# Altium footprint library Footprints.PcbLib: 196 footprints (part 1 of 13)
Each footprint in its own frame and in the unit in brackets; x right, y up, seen from the top. Pads: shape width x height; smd on the part's side, far side on the other; paste and mask are expansions set on the pad; w line width, h text height; cw(c..) or ccw(c..) is an arc to the next point about the centre after c.
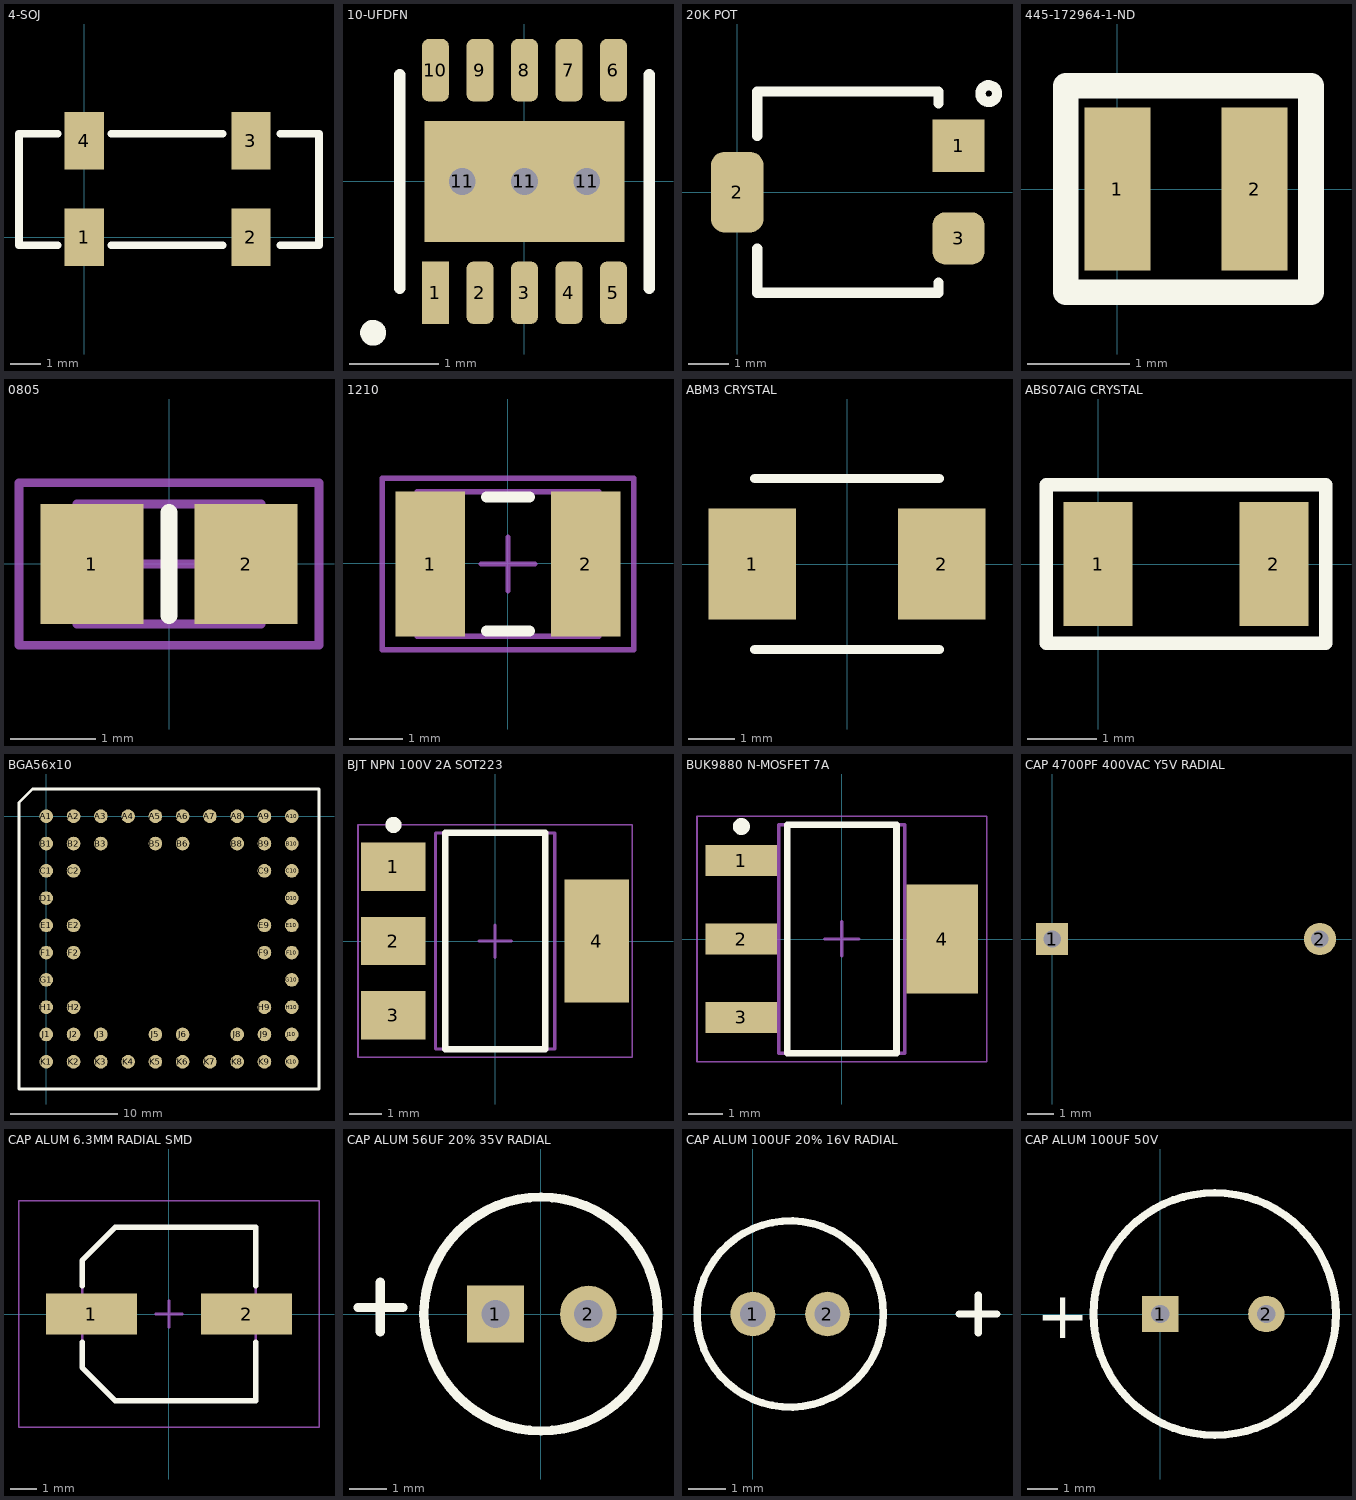
[diagram p0: the footprints below, top view; thin cyan lines are the x and y axes]

## 4-SOJ [mm]
pads (4):
  rect 1.3x1.9 smd: 1(0,0) 2(5.5,0) 3(5.5,3.2) 4(0,3.2)
Top Overlay:
  lines w0.254: -0.889,-0.254 -2.159,-0.254 -2.159,3.429 -0.889,3.429 ; 0.889,-0.254 4.572,-0.254 ; 0.889,3.429 4.572,3.429 ; 6.477,-0.254 7.747,-0.254 7.747,3.429 6.477,3.429

## 10-UFDFN [mm]
pads (14):
  rect 0.3x0.7 smd: 1(-1,-1.25)
  rrect50% 0.3x0.7 smd: 2(-0.5,-1.25) 3(0,-1.25) 4(0.5,-1.25) 5(1,-1.25) 6(1,1.25) 7(0.5,1.25) 8(0,1.25) 9(-0.5,1.25) 10(-1,1.25)
  round 0.6 hole 0.3: 11(-0.7,0) 11(0,0) 11(0.7,0)
  rect 2.25x1.36 smd paste-0.2: 11(0,0)
Top Overlay:
  circle w0.15: c-1.7,-1.7 r0.07
  lines w0.127: -1.4,-1.2 -1.4,1.2 ; 1.4,-1.2 1.4,1.2
3D body: height 0.6, standoff 0, extent -1.275,-1.275 1.275,1.275

## 20K POT [mm]
height 2.7
pads (3):
  rect 1.3x1.3 smd: 1(5.5,1.15)
  rrect50% 1.3x2 smd: 2(0,0)
  rrect50% 1.3x1.3 smd: 3(5.5,-1.15)
Top Overlay:
  circle w0.254: c6.25,2.45 r0.206
  lines w0.254: 0.5,-1.4 0.5,-2.5 5,-2.5 5,-2.25 ; 0.5,1.4 0.5,2.5 5,2.5 5,2.2

## 445-172964-1-ND [mm]
pads (2):
  rect 0.65x1.6 smd: 1(0,0) 2(1.35,0)
Top Overlay:
  lines w0.254: -0.508,-1.016 -0.508,1.016 1.905,1.016 1.905,-1.016 -0.508,-1.016

## 0805 [mm]
pads (2):
  rect 1.2x1.4 smd: 1(-0.903,-0.001) 2(0.897,-0.001)
Top Overlay:
  lines w0.2: -0.003,-0.601 -0.003,0.599
Mechanical 13:
  lines w0.1: -1.078,-0.701 1.072,-0.701 1.072,0.699 -1.078,0.699 -1.078,-0.701
Mechanical 15:
  lines w0.1: -0.503,-0.001 0.497,-0.001 ; -0.003,-0.501 -0.003,0.499 ; -1.753,-0.951 1.747,-0.951 1.747,0.949 -1.753,0.949 -1.753,-0.951
3D body: height 0.7, standoff 0, extent -1.078,-0.701 1.072,0.699

## 1210 [mm]
pads (2):
  rect 1.3x2.7 smd: 1(-1.441,-0.01) 2(1.459,-0.01)
Top Overlay:
  lines w0.2: -0.391,-1.26 0.409,-1.26 ; -0.391,1.24 0.409,1.24
Mechanical 13:
  lines w0.1: -1.691,-1.36 1.709,-1.36 1.709,1.34 -1.691,1.34 -1.691,-1.36
Mechanical 15:
  lines w0.1: -0.491,-0.01 0.509,-0.01 ; 0.009,-0.51 0.009,0.49 ; -2.341,-1.61 2.359,-1.61 2.359,1.59 -2.341,1.59 -2.341,-1.61
3D body: height 1.5, standoff 0, extent -1.691,-1.36 1.709,1.34

## ABM3 CRYSTAL [mm]
pads (2):
  rect 1.9x2.4 smd: 1(-2.05,0) 2(2.05,0)
Top Overlay:
  lines w0.2: -2,-1.85 2,-1.85 ; -2,1.85 2,1.85
3D body "ABM3.STEP": height 1.3, standoff 0, extent -2.5,-1.6 2.5,1.6

## ABS07AIG CRYSTAL [mm]
pads (2):
  rect 1x1.8 smd: 1(0,0) 2(2.55,0)
Top Overlay:
  lines w0.2: -0.75,-1.15 -0.75,1.15 3.3,1.15 3.3,-1.15 -0.75,-1.15
3D body "ABS07.STEP": height 0.89, standoff 0, extent -0.325,-0.749 2.875,0.749

## BGA56x10 [mm]
pads (56):
  round 1.27 smd: A1(0,0) A2(2.54,0) A3(5.08,0) A4(7.62,0) A5(10.16,0) A6(12.7,0) A7(15.24,0) A8(17.78,0) A9(20.32,0) A10(22.86,0) B1(0,-2.54) B2(2.54,-2.54) B3(5.08,-2.54) B5(10.16,-2.54) B6(12.7,-2.54) B8(17.78,-2.54) B9(20.32,-2.54) B10(22.86,-2.54) C1(0,-5.08) C2(2.54,-5.08) C9(20.32,-5.08) C10(22.86,-5.08) D1(0,-7.62) D10(22.86,-7.62) E1(0,-10.16) E2(2.54,-10.16) E9(20.32,-10.16) E10(22.86,-10.16) F1(0,-12.7) F2(2.54,-12.7) F9(20.32,-12.7) F10(22.86,-12.7) G1(0,-15.24) G10(22.86,-15.24) H1(0,-17.78) H2(2.54,-17.78) H9(20.32,-17.78) H10(22.86,-17.78) J1(0,-20.32) J2(2.54,-20.32) J3(5.08,-20.32) J5(10.16,-20.32) J6(12.7,-20.32) J8(17.78,-20.32) J9(20.32,-20.32) J10(22.86,-20.32) K1(0,-22.86) K2(2.54,-22.86) K3(5.08,-22.86) K4(7.62,-22.86) K5(10.16,-22.86) K6(12.7,-22.86) K7(15.24,-22.86) K8(17.78,-22.86) K9(20.32,-22.86) K10(22.86,-22.86)
Top Overlay:
  lines w0.254: -2.54,-25.4 -2.54,1.27 -1.27,2.54 25.4,2.54 25.4,-25.4 -2.54,-25.4

## BJT NPN 100V 2A SOT223 [mm] "SOT223, 4-Leads, Body 6.50x7.00mm (avg), Pitch 2.30mm, IPC Medium Density"
height 1.75
pads (4):
  rect 2x1.5 smd: 1(-3.15,2.3) 2(-3.15,0) 3(-3.15,-2.3)
  rect 2x3.8 smd: 4(3.15,0)
Top Overlay:
  circle w0.25: c-3.15,3.6 r0.125
  lines w0.2: -1.55,-3.35 1.55,-3.35 1.55,3.35 -1.55,3.35 -1.55,-3.35
Mechanical 13:
  lines w0.1: -1.85,-3.35 1.85,-3.35 1.85,3.35 -1.85,3.35 -1.85,-3.35
Mechanical 15:
  lines w0.05: -4.25,-3.6 4.25,-3.6 4.25,3.6 -4.25,3.6 -4.25,-3.6
  lines w0.1: -0.5,0 0.5,0 ; 0,-0.5 0,0.5
3D body "BJT NPN 100V 2A SOT223.step": height 1.75, standoff 0, extent -3.5,-3.35 3.5,3.35

## BUK9880 N-MOSFET 7A [mm] "SOT223, 4-Leads, Body 6.50x7.00mm (avg), Pitch 2.30mm, IPC Medium Density"
height 1.8
pads (4):
  rect 2.1x0.9 smd: 1(-2.95,2.3) 2(-2.95,0) 3(-2.95,-2.3)
  rect 2.1x3.2 smd: 4(2.95,0)
Top Overlay:
  circle w0.25: c-2.95,3.3 r0.125
  lines w0.2: -1.6,-3.35 -1.6,3.35 1.6,3.35 1.6,-3.35 -1.6,-3.35
Mechanical 13:
  lines w0.1: -1.85,-3.35 -1.85,3.35 1.85,3.35 1.85,-3.35 -1.85,-3.35
Mechanical 15:
  lines w0.05: -4.25,-3.6 -4.25,3.6 4.25,3.6 4.25,-3.6 -4.25,-3.6
  lines w0.1: -0.5,0 0.5,0 ; 0,-0.5 0,0.5
3D body "SOT230P700X180-4N.step": height 1.8, standoff 0, extent -3.5,-3.35 3.5,3.35

## CAP 4700PF 400VAC Y5V RADIAL [mm] "4700pF ?0% 400VAC Ceramic Capacitor Y5V (F) Radial, Disc"
pads (2):
  rect 1.2x1.2 hole 0.65: 1(0,0)
  round 1.2 hole 0.65: 2(10,0)
3D body "C951U472MVVDBA7317.step": height 16, standoff -19.8, extent -1,-3 11,2.502

## CAP ALUM 6.3MM RADIAL SMD [mm] "Aluminum Electrolytic Capacitor, Body 6.50x6.50x5.50mm, IPC Low Density"
height 5.5
pads (2):
  rect 3.45x1.55 smd: 1(-2.95,0) 2(2.95,0)
Top Overlay:
  lines w0.2: -3.3,-1.075 -3.3,-2.037 -2.037,-3.3 3.3,-3.3 3.3,-1.075 ; -3.3,1.075 -3.3,2.037 -2.037,3.3 3.3,3.3 3.3,1.075
Mechanical 13:
  lines w0.1: -3.3,-2.037 -3.3,2.037 -2.037,3.3 3.3,3.3 3.3,-3.3 -2.037,-3.3 -3.3,-2.037
Mechanical 15:
  lines w0.05: -5.7,-4.3 5.7,-4.3 5.7,4.3 -5.7,4.3 -5.7,-4.3
  lines w0.1: -0.5,0 0.5,0 ; 0,-0.5 0,0.5
3D body "CAP 6.3MM RADIAL SMD.step": height 5.5, standoff -0.8, extent -3.9,-3.3 3.9,3.3

## CAP ALUM 56UF 20% 35V RADIAL [mil] "56µF 35V Aluminum Electrolytic Capacitors Radial, Can 1000 Hrs @ 105°C"
pads (2):
  rect 60x60 hole 30: 1(-48.23,0)
  round 60 hole 30: 2(50.2,0)
Top Overlay:
  circle w10: c0,0 r124.02
  lines w10: -193.9,6.89 -146.65,6.89 ; -170.28,-18.7 -170.28,33.46
3D body: height 440.94, standoff 0, extent -124.02,-123.89 124.02,123.89

## CAP ALUM 100UF 20% 16V RADIAL [mm] "100µF 16V Aluminum Capacitors Radial, Can 2000 Hrs @ 105°C"
height 12.5
pads (2):
  round 1.2 hole 0.7: 1(0,0) 2(2,0)
Top Overlay:
  circle w0.2: c1,0 r2.5
  lines w0.2: 5.532,0 6.548,0 ; 6.04,-0.508 6.04,0.508

## CAP ALUM 100UF 50V [mm] "CAP ALUM 100UF 20% 50V RADIAL"
height 11
pads (2):
  rect 1.2x1.2 hole 0.6: 1(0,0)
  round 1.2 hole 0.6: 2(3.5,0)
Top Overlay:
  circle w0.254: c1.8,0 r4
  text "+" at -4.1,-0.8 h1.52
3D body "ESY107M050AG3AA.step": height 12.5, standoff -5, extent -2.45,-4.25 6.05,4.25